# Altium footprint library Pcblib.PcbLib: 281 footprints (part 4 of 18)
Each footprint in its own frame and in the unit in brackets; x right, y up, seen from the top. Pads: shape width x height; smd on the part's side, far side on the other; paste and mask are expansions set on the pad; w line width, h text height; cw(c..) or ccw(c..) is an arc to the next point about the centre after c.
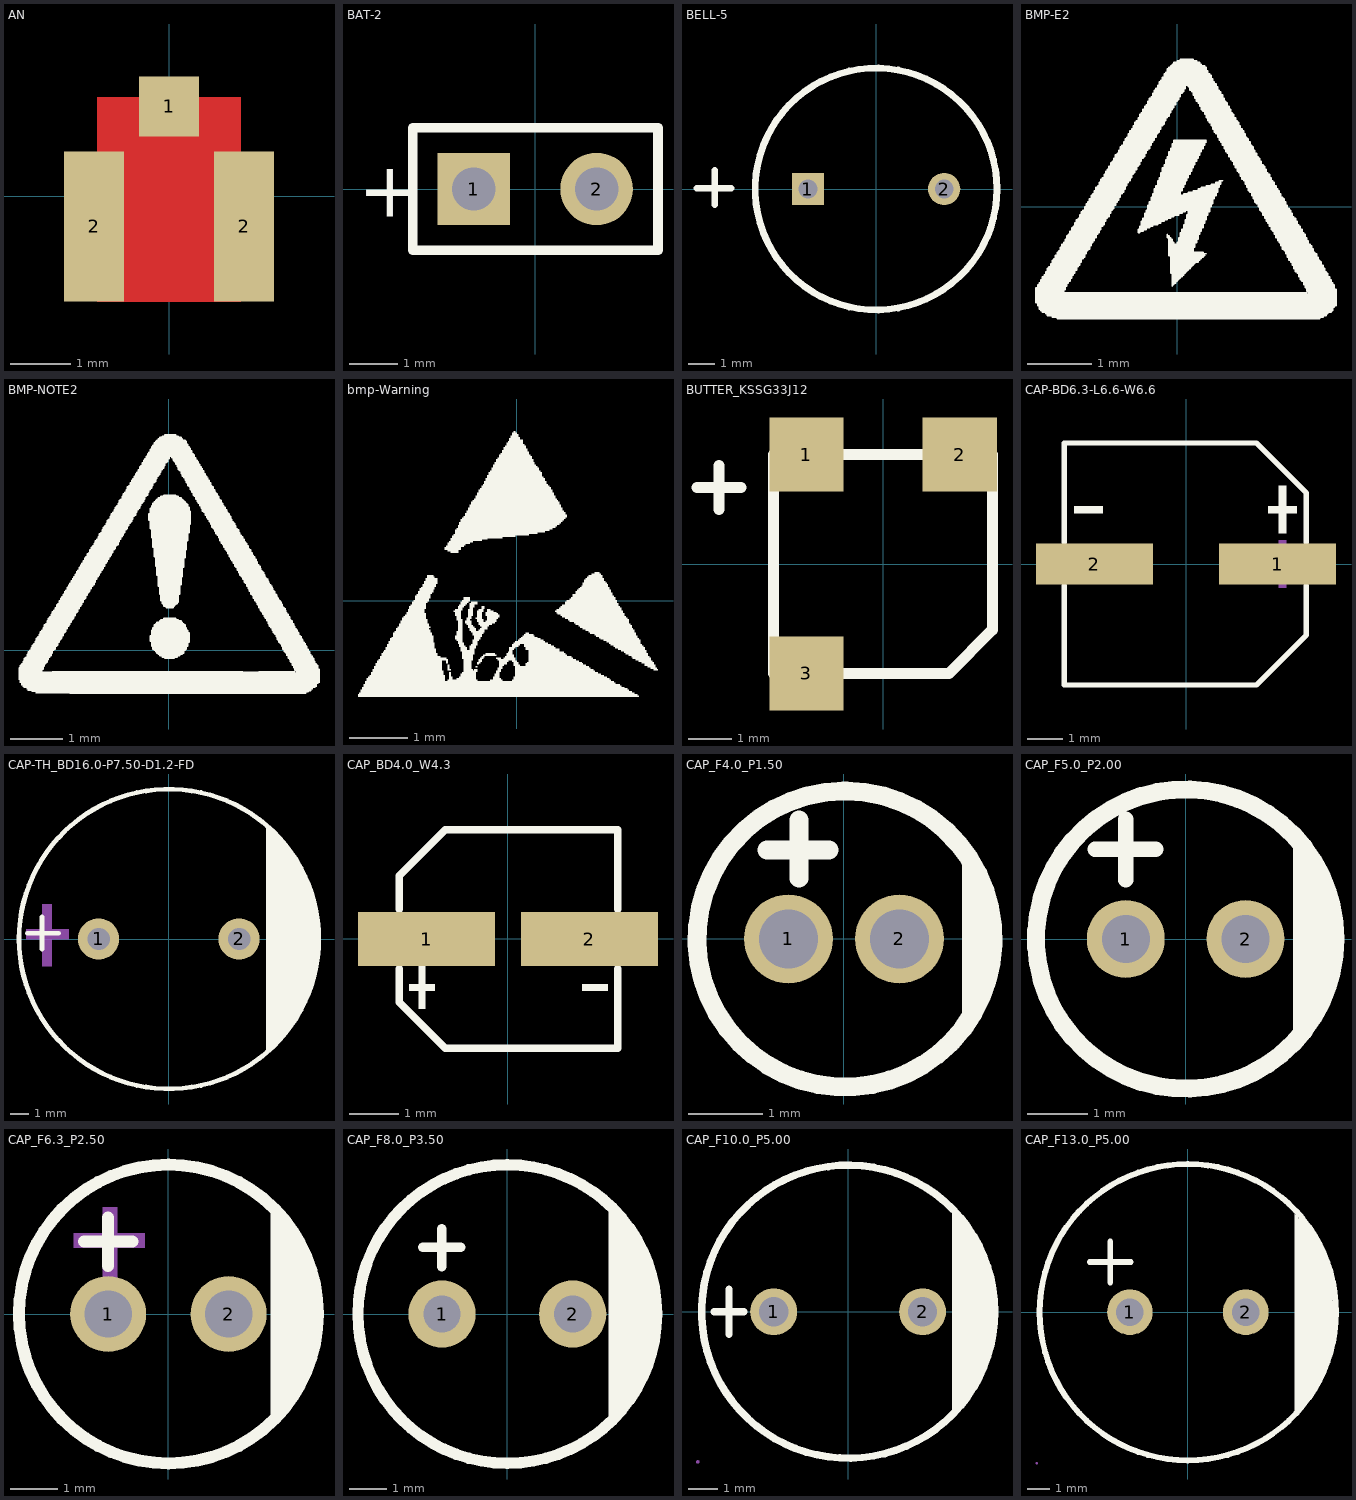
[diagram p3: the footprints below, top view; thin cyan lines are the x and y axes]

## AN [mm]
pads (3):
  rect 1x1 smd: 1(0,1.5)
  rect 1x2.5 smd: 2(-1.25,-0.5) 2(1.25,-0.5)
Top Layer:
  pour cut-out: -1.194,1.651 1.194,1.651 1.194,-1.753 -1.194,-1.753

## BAT-2 [mm] "Multicell Battery; 2 Leads"
pads (2):
  rect 1.5x1.5 hole 0.9: 1(-1.27,0)
  round 1.5 hole 0.9: 2(1.27,0)
Top Overlay:
  lines w0.2: -2.54,-1.27 -2.54,1.27 2.54,1.27 2.54,-1.27 -2.54,-1.27
  text "+" at -3.67,-0.577 h1.15

## BELL-5 [mm]
height 0.4
pads (2):
  rect 1.2x1.2 hole 0.7: 1(-2.54,0)
  round 1.2 hole 0.7: 2(2.54,0)
Top Overlay:
  circle w0.254: c0,0 r4.51
  lines w0.254: -6.68,0.025 -5.41,0.025 ; -6.02,-0.584 -6.02,0.686

## BMP-E2 [mm]
Top Overlay:
  drawing of 830 lines, arcs and shapes, not listed

## BMP-NOTE2 [mm]
Top Overlay:
  drawing of 1256 lines, arcs and shapes, not listed

## bmp-Warning [mm]
height 1.1
Top Overlay:
  drawing of 433 lines, arcs and shapes, not listed

## BUTTER_KSSG33J12 [mm]
pads (3):
  rect 1.7x1.7 smd: 1(-1.75,2.5) 2(1.75,2.5) 3(-1.75,-2.5)
Top Overlay:
  lines w0.254: -4.25,1.75 -3.25,1.75 ; -3.75,1.25 -3.75,2.25 ; -2.5,-2.5 1.5,-2.5 2.5,-1.5 2.5,2.5 -2.5,2.5 -2.5,-2.5
3D body: height 2, standoff 0.02, extent -2.5,-2.5 2.5,2.5

## CAP-BD6.3-L6.6-W6.6 [mm]
pads (2):
  rect 3.26x1.15 smd: 1(2.555,0) 2(-2.555,0)
Top Overlay:
  region: -3.117,1.419 -3.117,1.617 -2.325,1.617 -2.325,1.419
  region: 3.087,1.419 3.087,1.617 2.295,1.617 2.295,1.419
  region: 2.79,0.858 2.79,2.178 2.592,2.178 2.592,0.858
  lines w0.152: -3.391,-0.607 -3.391,-3.376 1.965,-3.376 3.361,-1.98 3.361,-0.607 ; -3.391,0.607 -3.391,3.376 1.965,3.376 3.361,1.98 3.361,0.607
Mechanical 15:
  region: -3.117,-0.099 -3.117,0.099 -2.325,0.099 -2.325,-0.099
  region: 3.087,-0.099 3.087,0.099 2.295,0.099 2.295,-0.099
  region: 2.79,-0.66 2.79,0.66 2.592,0.66 2.592,-0.66

## CAP-TH_BD16.0-P7.50-D1.2-FD [mm]
pads (2):
  round 2.2 hole 1.2: 1(-3.75,0) 2(3.75,0)
Top Overlay:
  circle w0.254: c0,0 r8
  region: 5.208,-6.097 5.653,-5.699 6.255,-5.025 6.778,-4.288 7.215,-3.497 7.561,-2.662 7.812,-1.793 7.963,-0.902 8.014,0 7.963,0.902 7.812,1.793 7.561,2.662 7.215,3.497 6.778,4.288 6.255,5.025 5.653,5.699 5.208,6.097 5.207,6.096
  lines w0.254: -7.553,0.305 -5.877,0.305 ; -6.766,-0.533 -6.766,1.194
Mechanical 15:
  region: 7.7,-0.2 5.414,-0.2 5.414,0.308 7.7,0.308
  region: -6.754,1.851 -6.246,1.851 -6.246,-1.451 -6.754,-1.451
  region: -7.62,0.508 -5.334,0.508 -5.334,0 -7.62,0

## CAP_BD4.0_W4.3 [mm]
pads (2):
  rect 2.8x1.1 smd: 1(-1.66,0) 2(1.66,0)
Top Overlay:
  region: 2.031,-0.925 2.031,-1.054 1.515,-1.054 1.515,-0.925
  region: -2.011,-0.925 -2.011,-1.054 -1.495,-1.054 -1.495,-0.925
  region: -1.818,-0.559 -1.818,-1.419 -1.689,-1.419 -1.689,-0.559
  lines w0.152: -2.217,-0.607 -2.217,-1.29 -1.28,-2.226 2.236,-2.226 2.236,-0.607 ; -2.217,0.607 -2.217,1.29 -1.28,2.226 2.236,2.226 2.236,0.607
Mechanical 15:
  region: 2.031,0.064 2.031,-0.065 1.515,-0.065 1.515,0.064
  region: -2.011,0.064 -2.011,-0.065 -1.495,-0.065 -1.495,0.064
  region: -1.818,0.43 -1.818,-0.43 -1.689,-0.43 -1.689,0.43
3D body "User Library-SMD Polymer Aluminum Electrolytic Capacitors A5 10uF 10V.STEP": height 5.45, standoff 0, extent -2.515,-2.141 2.485,2.159

## CAP_F4.0_P1.50 [mm]
pads (2):
  round 1.2 hole 0.8: 1(-0.751,0) 2(0.751,0)
Top Overlay:
  region: 1.601,-1.201 1.763,-1.003 1.93,-0.691 2.033,-0.352 2.068,0 2.033,0.352 1.93,0.691 1.763,1.004 1.601,1.201 1.6,1.2
  lines w0.254: -1.038,1.2 -0.2,1.2 ; -0.606,0.819 -0.606,1.606 ; -0.001,1.999 ccw(c0.015,-0.001) 0.032,1.999
Mechanical 5:
  circle w0.3: c0.751,0 r0.15
  circle w0.3: c-0.751,0 r0.15

## CAP_F5.0_P2.00 [mm]
pads (2):
  round 1.3 hole 0.8: 1(-1,0) 2(1,0)
Top Overlay:
  circle w0.3: c0,0 r2.5
  region: 1.799,1.656 1.839,1.622 2.124,1.275 2.336,0.878 2.467,0.448 2.511,0 2.467,-0.448 2.336,-0.878 2.124,-1.275 1.839,-1.622 1.799,-1.656 1.794,-1.651
  lines w0.254: -1.516,1.5 -0.5,1.5 ; -1,0.984 -1,2
Mechanical 5:
  circle w0.3: c-1,0 r0.15
  circle w0.3: c1,0 r0.15

## CAP_F6.3_P2.50 [mm]
pads (2):
  round 1.6 hole 1: 1(-1.27,0) 2(1.27,0)
Top Overlay:
  circle w0.254: c0,0 r3.15
  region: 2.159,2.286 2.319,2.142 2.595,1.812 2.822,1.447 2.997,1.054 3.115,0.641 3.175,0.215 3.175,-0.215 3.115,-0.641 2.997,-1.054 2.822,-1.447 2.595,-1.812 2.319,-2.142 2.159,-2.286
  lines w0.254: -1.778,1.524 -0.762,1.524 ; -1.27,1.016 -1.27,2.032
Mechanical 15:
  region: -2,1.7 -0.5,1.7 -0.5,1.4 -2,1.4
  region: -1.381,0.752 -1.381,2.252 -1.081,2.252 -1.081,0.752

## CAP_F8.0_P3.50 [mm]
pads (2):
  round 1.8 hole 1: 1(-1.75,0) 2(1.75,0)
Top Overlay:
  circle w0.3: c0,0 r4
  region: 2.718,2.946 3.404,2.083 3.649,1.209 3.861,0.813 3.991,0.382 4.035,-0.065 3.991,-0.513 3.861,-0.943 3.649,-1.34 3.531,-1.981 2.718,-2.972
  lines w0.254: -2.269,1.786 -1.253,1.786 ; -1.753,1.27 -1.753,2.286

## CAP_F10.0_P5.00 [mm]
pads (2):
  round 1.6 hole 1: 1(-2.54,0) 2(2.54,0)
Top Overlay:
  circle w0.254: c0,0 r4.999
  region: 3.556,3.556 3.556,-3.556 4.318,-2.54 4.826,-1.016 5.08,0.508 4.826,1.524
  lines w0.254: -4.572,0 -3.556,0 ; -4.064,-0.762 -4.064,0.762
Mechanical 5:
  circle w0.4: c-2.54,0 r0.2
  circle w0.4: c2.54,0 r0.2
Mechanical 6:
  circle w0.06: c-5.126,-5.126 r0.03

## CAP_F13.0_P5.00 [mm]
pads (2):
  round 2 hole 1.2: 1(-2.54,0) 2(2.54,0)
Top Overlay:
  circle w0.254: c-0.001,0 r6.5
  region: 4.7,4.3 4.7,-4.5 5.8,-3 6.3,-1.7 6.4,-0.5 6.3,1.5 5.7,3.2
  lines w0.254: -4.301,2.2 -2.501,2.2 ; -3.401,1.3 -3.401,3.1
Mechanical 5:
  circle w0.5: c2.54,0 r0.25
  circle w0.5: c-2.54,0 r0.25
Mechanical 6:
  circle w0.06: c-6.628,-6.627 r0.03